# Altium footprint library PartsDatabaseV16.1.PcbLib: 145 footprints (part 5 of 10)
Each footprint in its own frame and in the unit in brackets; x right, y up, seen from the top. Pads: shape width x height; smd on the part's side, far side on the other; paste and mask are expansions set on the pad; w line width, h text height; cw(c..) or ccw(c..) is an arc to the next point about the centre after c.
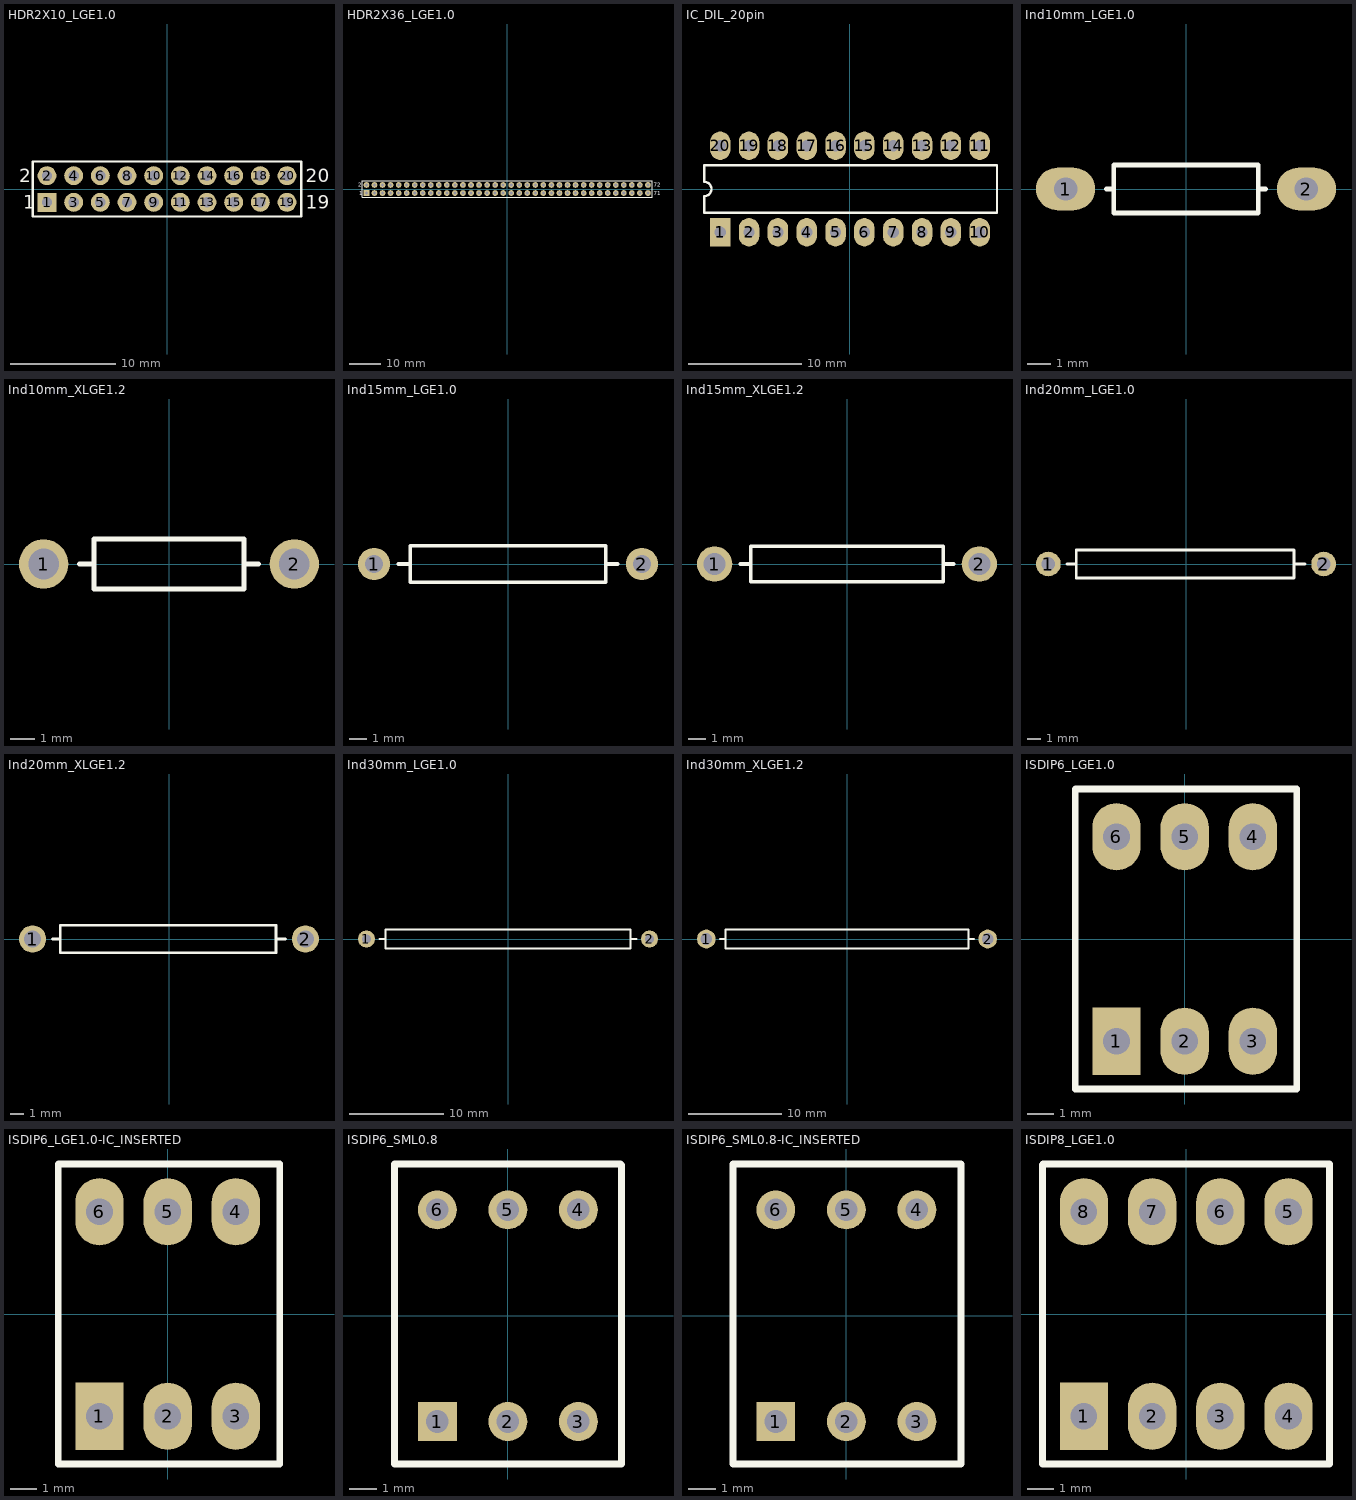
[diagram p4: the footprints below, top view; thin cyan lines are the x and y axes]

## HDR2X10_LGE1.0 [mm] "Connector; Header; 10x2 Position"
pads (20):
  rect 1.8x1.8 hole 0.991: 1(-11.43,-1.27)
  round 1.8 hole 0.991: 2(-11.43,1.27) 3(-8.89,-1.27) 4(-8.89,1.27) 5(-6.35,-1.27) 6(-6.35,1.27) 7(-3.81,-1.27) 8(-3.81,1.27) 9(-1.27,-1.27) 10(-1.27,1.27) 11(1.27,-1.27) 12(1.27,1.27) 13(3.81,-1.27) 14(3.81,1.27) 15(6.35,-1.27) 16(6.35,1.27) 17(8.89,-1.27) 18(8.89,1.27) 19(11.43,-1.27) 20(11.43,1.27)
Top Overlay:
  lines w0.2: -12.789,-2.629 -12.789,2.616 -12.776,2.629 12.789,2.629 12.789,-2.629 -12.789,-2.629
  text "2" at -14.097,0.635 h1.27
  text "1" at -13.674,-1.905 h1.27
  text "19" at 13.208,-1.905 h1.27
  text "20" at 13.208,0.635 h1.27
3D body "Header1x10.STEP": height 8.54, standoff -3, extent -12.675,0.025 12.725,2.515
3D body "Header1x10.STEP": height 8.54, standoff -3, extent -12.674,-2.515 12.726,-0.025

## HDR2X36_LGE1.0 [mm] "Connector; Header; 36x2 Position"
pads (72):
  rect 1.8x1.8 hole 0.991: 1(-44.45,-1.27)
  round 1.8 hole 0.991: 2(-44.45,1.27) 3(-41.91,-1.27) 4(-41.91,1.27) 5(-39.37,-1.27) 6(-39.37,1.27) 7(-36.83,-1.27) 8(-36.83,1.27) 9(-34.29,-1.27) 10(-34.29,1.27) 11(-31.75,-1.27) 12(-31.75,1.27) 13(-29.21,-1.27) 14(-29.21,1.27) 15(-26.67,-1.27) 16(-26.67,1.27) 17(-24.13,-1.27) 18(-24.13,1.27) 19(-21.59,-1.27) 20(-21.59,1.27) 21(-19.05,-1.27) 22(-19.05,1.27) 23(-16.51,-1.27) 24(-16.51,1.27) 25(-13.97,-1.27) 26(-13.97,1.27) 27(-11.43,-1.27) 28(-11.43,1.27) 29(-8.89,-1.27) 30(-8.89,1.27) 31(-6.35,-1.27) 32(-6.35,1.27) 33(-3.81,-1.27) 34(-3.81,1.27) 35(-1.27,-1.27) 36(-1.27,1.27) 37(1.27,-1.27) 38(1.27,1.27) 39(3.81,-1.27) 40(3.81,1.27) 41(6.35,-1.27) 42(6.35,1.27) 43(8.89,-1.27) 44(8.89,1.27) 45(11.43,-1.27) 46(11.43,1.27) 47(13.97,-1.27) 48(13.97,1.27) 49(16.51,-1.27) 50(16.51,1.27) 51(19.05,-1.27) 52(19.05,1.27) 53(21.59,-1.27) 54(21.59,1.27) 55(24.13,-1.27) 56(24.13,1.27) 57(26.67,-1.27) 58(26.67,1.27) 59(29.21,-1.27) 60(29.21,1.27) 61(31.75,-1.27) 62(31.75,1.27) 63(34.29,-1.27) 64(34.29,1.27) 65(36.83,-1.27) 66(36.83,1.27) 67(39.37,-1.27) 68(39.37,1.27) 69(41.91,-1.27) 70(41.91,1.27) 71(44.45,-1.27) 72(44.45,1.27)
Top Overlay:
  lines w0.2: -45.809,-2.629 45.847,-2.629 45.847,2.629 -45.796,2.629 -45.809,2.616 -45.809,-2.629
  text "72" at 46.355,0.635 h1.27
  text "71" at 46.355,-1.905 h1.27
  text "1" at -46.694,-1.905 h1.27
  text "2" at -47.117,0.635 h1.27
3D body "Header1x10.STEP": height 8.54, standoff -3, extent -45.694,-2.515 -20.294,-0.025
3D body "Header1x10.STEP": height 8.54, standoff -3, extent -45.695,0.025 -20.295,2.515
3D body "Header1x10.STEP": height 8.54, standoff -3, extent -22.834,-2.515 2.566,-0.025
3D body "Header1x10.STEP": height 8.54, standoff -3, extent 20.346,-2.515 45.746,-0.025
3D body "Header1x10.STEP": height 8.54, standoff -3, extent -5.054,-2.515 20.346,-0.025
3D body "Header1x10.STEP": height 8.54, standoff -3, extent -22.834,0.025 2.566,2.515
3D body "Header1x10.STEP": height 8.54, standoff -3, extent 0.026,0.025 25.426,2.515
3D body "Header1x10.STEP": height 8.54, standoff -3, extent 20.346,0.025 45.746,2.515

## IC_DIL_20pin [mm] "20-pin dual-in-line integrated circuit"
pads (20):
  rect 1.8x2.5 hole 0.991: 1(-11.43,-3.81)
  oval 1.8x2.5 hole 0.991: 2(-8.89,-3.81) 3(-6.35,-3.81) 4(-3.81,-3.81) 5(-1.27,-3.81) 6(1.27,-3.81) 7(3.81,-3.81) 8(6.35,-3.81) 9(8.89,-3.81) 10(11.43,-3.81) 11(11.43,3.81) 12(8.89,3.81) 13(6.35,3.81) 14(3.81,3.81) 15(1.27,3.81) 16(-1.27,3.81) 17(-3.81,3.81) 18(-6.35,3.81) 19(-8.89,3.81) 20(-11.43,3.81)
Top Overlay:
  lines w0.2: -12.84,-2.095 -12.84,-0.635 ccw(c-12.84,0) -12.84,0.635 -12.84,2.095 12.954,2.095 12.954,-2.095 -12.84,-2.095
3D body "DIP20.STEP": height 4.52, standoff -3.86, extent -13.332,-3.91 13.208,3.91

## Ind10mm_LGE1.0 [mm] "Thru-Hole; 2 Leads"
pads (2):
  oval 2.5x1.8 hole 0.991: 1(-5.08,0) 2(5.08,0)
Top Overlay:
  lines w0.2: -3.365,0 -3.048,0 ; 3.048,0 3.365,0 ; -3.048,-1.016 -3.048,1.016 3.048,1.016 3.048,-1.016 -3.048,-1.016

## Ind10mm_XLGE1.2 [mm] "Thru-Hole; 2 Leads"
pads (2):
  round 2 hole 1.245: 1(-5.08,0) 2(5.08,0)
Top Overlay:
  lines w0.2: -3.619,0 -3.048,0 ; 3.048,0 3.619,0 ; -3.048,-1.016 3.048,-1.016 3.048,1.016 -3.048,1.016 -3.048,-1.016

## Ind15mm_LGE1.0 [mm] "Thru-Hole; 2 Leads"
pads (2):
  round 1.8 hole 0.991: 1(-7.493,0) 2(7.493,0)
Top Overlay:
  lines w0.2: -6.134,0 -5.461,0 ; 5.461,0 6.134,0 ; -5.461,-1.016 5.461,-1.016 5.461,1.016 -5.461,1.016 -5.461,-1.016

## Ind15mm_XLGE1.2 [mm] "Thru-Hole; 2 Leads"
pads (2):
  round 2 hole 1.245: 1(-7.493,0) 2(7.493,0)
Top Overlay:
  lines w0.2: -6.032,0 -5.461,0 ; 5.461,0 6.032,0 ; -5.461,-1.016 -5.461,1.016 5.461,1.016 5.461,-1.016 -5.461,-1.016

## Ind20mm_LGE1.0 [mm] "Thru-Hole; 2 Leads"
pads (2):
  round 1.8 hole 0.991: 1(-10.033,0) 2(10.033,0)
Top Overlay:
  lines w0.2: -8.674,0 -8.001,0 ; 7.95,0 8.674,0 ; -8.001,-1.016 -8.001,1.016 7.874,1.016 7.874,-1.016 -8.001,-1.016

## Ind20mm_XLGE1.2 [mm] "Thru-Hole; 2 Leads"
pads (2):
  round 2 hole 1.245: 1(-10.033,0) 2(10.033,0)
Top Overlay:
  lines w0.2: -8.572,0 -8.001,0 ; 7.938,0 8.572,0 ; -8.001,-1.016 -8.001,1.016 7.874,1.016 7.874,-1.016 -8.001,-1.016

## Ind30mm_LGE1.0 [mm] "Thru-Hole; 2 Leads"
pads (2):
  round 1.8 hole 0.991: 1(-15.05,0) 2(15.05,0)
Top Overlay:
  lines w0.2: -13.691,0 -13.018,0 ; 13.018,0 13.691,0 ; -13.018,-1.016 13.018,-1.016 13.018,1.016 -13.018,1.016 -13.018,-1.016

## Ind30mm_XLGE1.2 [mm] "Thru-Hole; 2 Leads"
pads (2):
  round 2 hole 1.245: 1(-15.05,0) 2(15.05,0)
Top Overlay:
  lines w0.2: -13.589,0 -13.018,0 ; 13.018,0 13.589,0 ; -13.018,-1.016 -13.018,1.016 13.018,1.016 13.018,-1.016 -13.018,-1.016

## ISDIP6_LGE1.0 [mm] "DIP; 8 Rectangular Pins; Row Space 7.62 mm; Pitch 2.54 mm"
height 11.94
pads (6):
  rect 1.8x2.5 hole 0.991: 1(-2.54,-3.81)
  oval 1.8x2.5 hole 0.991: 2(0,-3.81) 3(2.54,-3.81) 4(2.54,3.81) 5(0,3.81) 6(-2.54,3.81)
Top Overlay:
  lines w0.25: -4.08,5.563 -4.08,3.175 -4.08,-5.588 4.178,-5.588 4.178,5.588 -4.064,5.588
3D body "DIP6_socket.step": height 5, standoff -3, extent -3.721,-5.016 3.899,5.144

## ISDIP6_LGE1.0-IC_INSERTED [mm] "DIP; 8 Rectangular Pins; Row Space 7.62 mm; Pitch 2.54 mm"
height 11.94
pads (6):
  rect 1.8x2.5 hole 0.991: 1(-2.54,-3.81)
  oval 1.8x2.5 hole 0.991: 2(0,-3.81) 3(2.54,-3.81) 4(2.54,3.81) 5(0,3.81) 6(-2.54,3.81)
Top Overlay:
  lines w0.25: -4.08,5.563 -4.08,3.175 -4.08,-5.588 4.178,-5.588 4.178,5.588 -4.064,5.588
3D body "DIP6_socket.step": height 5, standoff -3, extent -3.772,-5.118 3.848,5.042
3D body "DIP6.STEP": height 7.69, standoff 0.39, extent -3.513,-3.833 3.607,4.037

## ISDIP6_SML0.8 [mm] "DIP; 8 Rectangular Pins; Row Space 7.62 mm; Pitch 2.54 mm"
height 11.94
pads (6):
  rect 1.4x1.4 hole 0.813: 1(-2.54,-3.81)
  round 1.4 hole 0.813: 2(0,-3.81) 3(2.54,-3.81) 4(2.54,3.81) 5(0,3.81) 6(-2.54,3.81)
Top Overlay:
  lines w0.25: -4.08,5.461 -4.08,-5.34 4.089,-5.34 4.089,5.423
  lines w0.254: -4.039,5.461 4.051,5.461 4.089,5.423
3D body "DIP6_socket.step": height 5, standoff -3, extent -3.797,-5.017 3.823,5.143

## ISDIP6_SML0.8-IC_INSERTED [mm] "DIP; 8 Rectangular Pins; Row Space 7.62 mm; Pitch 2.54 mm"
height 11.94
pads (6):
  rect 1.4x1.4 hole 0.813: 1(-2.54,-3.81)
  round 1.4 hole 0.813: 2(0,-3.81) 3(2.54,-3.81) 4(2.54,3.81) 5(0,3.81) 6(-2.54,3.81)
Top Overlay:
  lines w0.25: -4.08,5.461 -4.08,-5.34 4.127,-5.34 4.127,5.461
  lines w0.254: -4.039,5.461 4.127,5.461
3D body "DIP6.STEP": height 7.69, standoff 0.39, extent -3.522,-3.912 3.598,3.958
3D body "DIP6_socket.step": height 5, standoff -3, extent -3.797,-5.029 3.823,5.131

## ISDIP8_LGE1.0 [mm] "DIP; 8 Rectangular Pins; Row Space 7.62 mm; Pitch 2.54 mm"
height 11.94
pads (8):
  rect 1.8x2.5 hole 0.991: 1(-3.81,-3.81)
  oval 1.8x2.5 hole 0.991: 2(-1.27,-3.81) 3(1.27,-3.81) 4(3.81,-3.81) 5(3.81,3.81) 6(1.27,3.81) 7(-1.27,3.81) 8(-3.81,3.81)
Top Overlay:
  lines w0.25: -5.35,5.563 -5.35,3.175 -5.35,-5.588 5.334,-5.588 5.334,5.588 -5.334,5.588
3D body "DIP8_socket.step": height 5, standoff -3, extent -5.105,-5.131 5.055,5.029